# Altium footprint library 3.22-杂项.PcbLib: 985 footprints (part 41 of 64)
Each footprint in its own frame and in the unit in brackets; x right, y up, seen from the top. Pads: shape width x height; smd on the part's side, far side on the other; paste and mask are expansions set on the pad; w line width, h text height; cw(c..) or ccw(c..) is an arc to the next point about the centre after c.
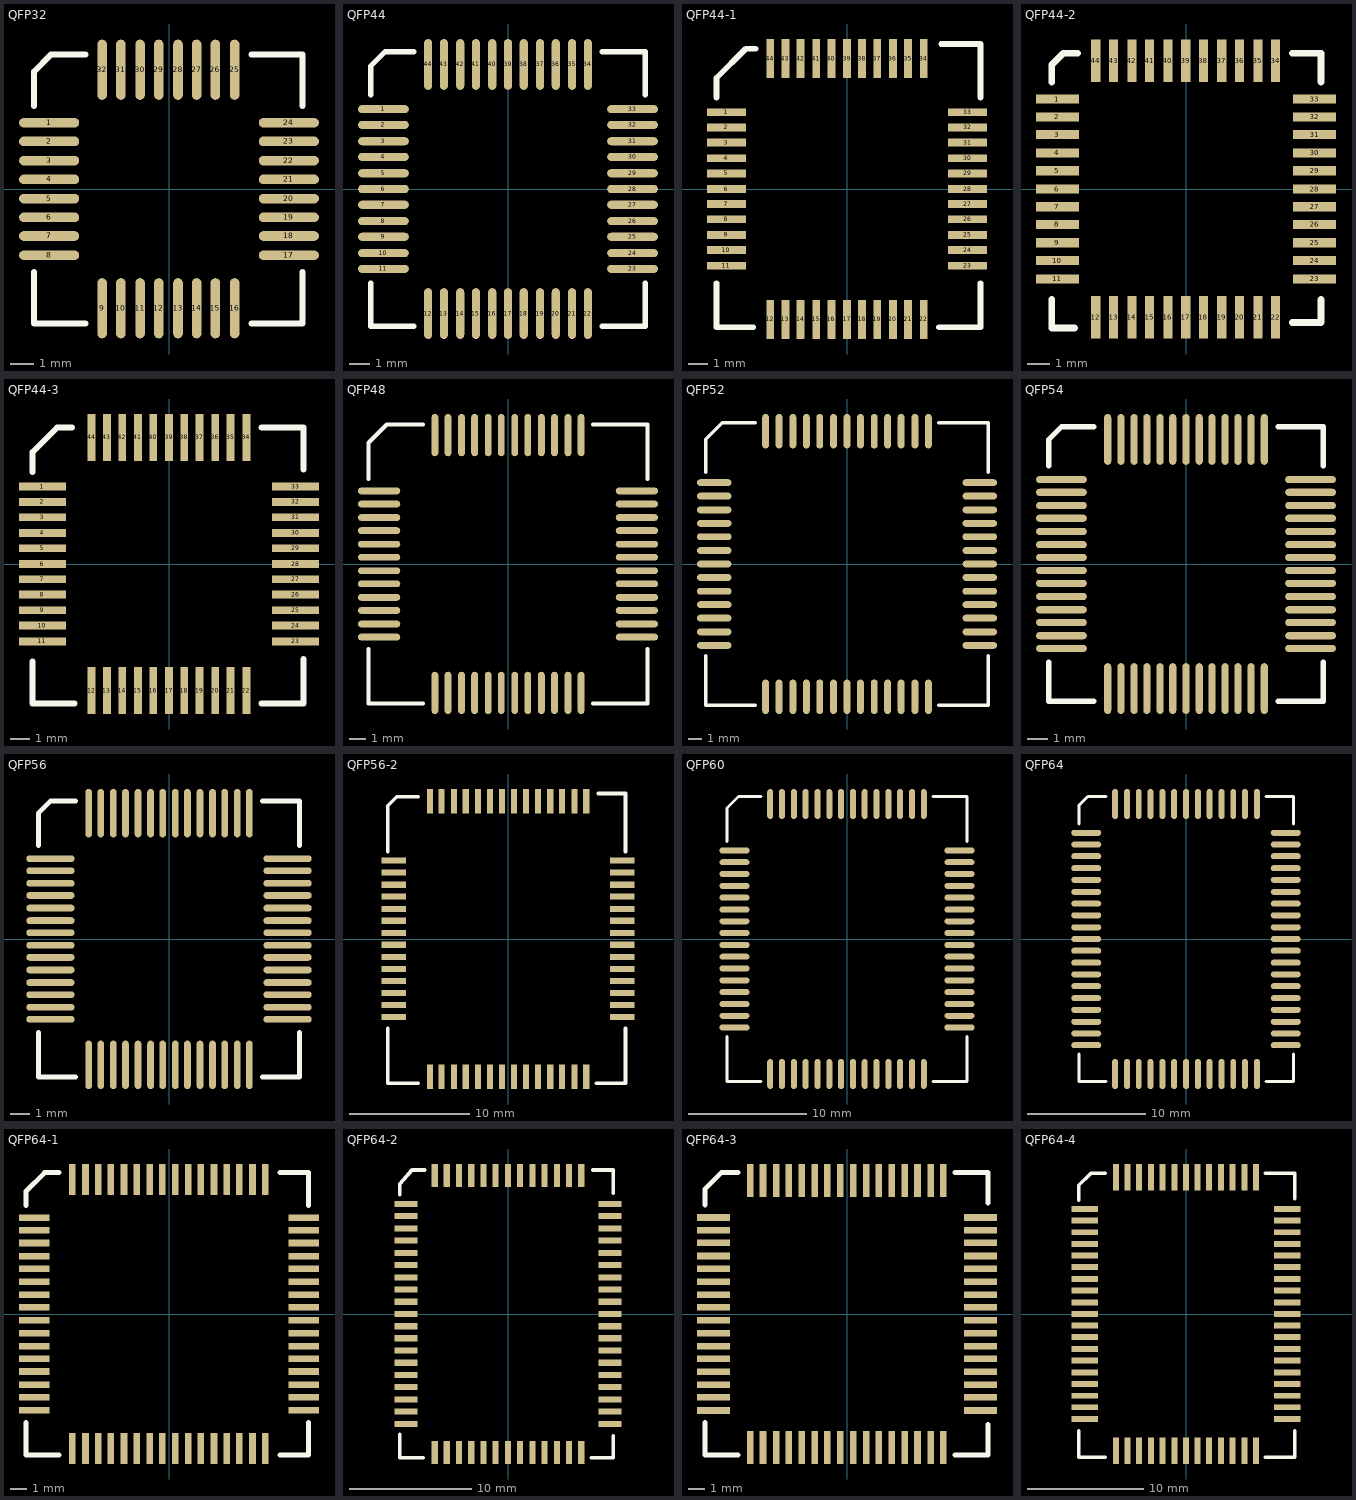
[diagram p40: the footprints below, top view; thin cyan lines are the x and y axes]

## QFP32 [mil] "ATmega16L-8AI"
pads (32):
  oval 100x16 smd: 1(-199,110) 2(-199,79) 3(-199,47) 4(-199,16) 5(-199,-16) 6(-199,-47) 7(-199,-78) 8(-199,-110) 17(199,-110) 18(199,-78) 19(199,-47) 20(199,-16) 21(199,16) 22(199,47) 23(199,79) 24(199,110)
  oval 16x100 smd: 9(-111,-198) 10(-80,-198) 11(-48,-198) 12(-17,-198) 13(15,-198) 14(46,-198) 15(77,-198) 16(109,-198) 25(109,198) 26(77,198) 27(46,198) 28(15,198) 29(-17,198) 30(-48,198) 31(-80,198) 32(-111,198)
Top Overlay:
  lines w10: -224,-138 -224,-223 -139,-223 ; -224,138 -224,195 -196,223 -139,223 ; 137,-223 222,-223 222,-138 ; 137,223 222,223 222,138

## QFP44 [mil] "ATmega16L-8AI"
pads (44):
  oval 100x16 smd: 1(-245,157) 2(-245,126) 3(-245,94) 4(-245,63) 5(-245,31) 6(-245,0) 7(-245,-31) 8(-245,-63) 9(-245,-94) 10(-245,-126) 11(-245,-157) 23(245,-157) 24(245,-126) 25(245,-94) 26(245,-63) 27(245,-31) 28(245,0) 29(245,31) 30(245,63) 31(245,94) 32(245,126) 33(245,157)
  oval 16x100 smd: 12(-157,-245) 13(-126,-245) 14(-94,-245) 15(-63,-245) 16(-31,-245) 17(0,-245) 18(31,-245) 19(63,-245) 20(94,-245) 21(126,-245) 22(157,-245) 34(157,245) 35(126,245) 36(94,245) 37(63,245) 38(31,245) 39(0,245) 40(-31,245) 41(-63,245) 42(-94,245) 43(-126,245) 44(-157,245)
Top Overlay:
  lines w10: -270,-185 -270,-270 -185,-270 ; -270,185 -270,242 -242,270 -185,270 ; 185,-270 270,-270 270,-185 ; 185,270 270,270 270,185

## QFP44-1 [mil]
pads (44):
  rect 80x16 smd: 1(-247,157) 2(-247,126) 3(-247,95) 4(-247,63) 5(-247,32) 6(-247,0) 7(-247,-31) 8(-247,-62) 9(-247,-94) 10(-247,-125) 11(-247,-157) 23(247,-157) 24(247,-125) 25(247,-94) 26(247,-62) 27(247,-31) 28(247,0) 29(247,32) 30(247,63) 31(247,95) 32(247,126) 33(247,157)
  rect 16x80 smd: 12(-157,-267) 13(-126,-267) 14(-95,-267) 15(-63,-267) 16(-32,-267) 17(0,-267) 18(31,-267) 19(62,-267) 20(94,-267) 21(125,-267) 22(157,-267) 34(157,267) 35(125,267) 36(94,267) 37(62,267) 38(31,267) 39(0,267) 40(-32,267) 41(-63,267) 42(-95,267) 43(-126,267) 44(-157,267)
Top Overlay:
  lines w12: -267,-193 -267,-283 -192,-283 ; -267,187 -267,227 -207,287 -187,287 ; 188,-283 273,-283 273,-193 ; 193,297 273,297 273,187

## QFP44-2 [mil]
pads (44):
  rect 75x16 smd: 1(-224.5,157) 2(-224.5,126) 3(-224.5,95) 4(-224.5,63) 5(-224.5,32) 6(-224.5,0) 7(-224.5,-31) 8(-224.5,-62) 9(-224.5,-94) 10(-224.5,-125) 11(-224.5,-157) 23(224.5,-157) 24(224.5,-125) 25(224.5,-94) 26(224.5,-62) 27(224.5,-31) 28(224.5,0) 29(224.5,32) 30(224.5,63) 31(224.5,95) 32(224.5,126) 33(224.5,157)
  rect 16x75 smd: 12(-157.5,-224) 13(-126.5,-224) 14(-94.5,-224) 15(-63.5,-224) 16(-31.5,-224) 17(-0.5,-224) 18(30.5,-224) 19(62.5,-224) 20(93.5,-224) 21(125.5,-224) 22(156.5,-224) 34(156.5,224) 35(125.5,224) 36(93.5,224) 37(62.5,224) 38(30.5,224) 39(-0.5,224) 40(-31.5,224) 41(-63.5,224) 42(-94.5,224) 43(-126.5,224) 44(-157.5,224)
Top Overlay:
  lines w12: -234.5,-193 -234.5,-243 -194.5,-243 ; -234.5,187 -234.5,217 -214.5,237 -189.5,237 ; 185.5,-233 235.5,-233 235.5,-193 ; 185.5,237 235.5,237 235.5,187

## QFP44-3 [mil]
pads (44):
  rect 95x16 smd: 1(-257,157) 2(-257,126) 3(-257,95) 4(-257,63) 5(-257,32) 6(-257,0) 7(-257,-31) 8(-257,-62) 9(-257,-94) 10(-257,-125) 11(-257,-157) 23(257,-157) 24(257,-125) 25(257,-94) 26(257,-62) 27(257,-31) 28(257,0) 29(257,32) 30(257,63) 31(257,95) 32(257,126) 33(257,157)
  rect 16x95 smd: 12(-157,-257) 13(-126,-257) 14(-95,-257) 15(-63,-257) 16(-32,-257) 17(0,-257) 18(31,-257) 19(62,-257) 20(94,-257) 21(125,-257) 22(157,-257) 34(157,257) 35(125,257) 36(94,257) 37(62,257) 38(31,257) 39(0,257) 40(-32,257) 41(-63,257) 42(-95,257) 43(-126,257) 44(-157,257)
Top Overlay:
  lines w12: -277,-198 -277,-283 -192,-283 ; -277,187 -277,227 -227,277 -197,277 ; 188,-283 273,-283 273,-193 ; 188,277 273,277 273,192

## QFP48 [mil]
pads (48):
  oval 100x16 smd: 1(-305,173) 2(-305,142) 3(-305,110) 4(-305,79) 5(-305,47) 6(-305,16) 7(-305,-16) 8(-305,-47) 9(-305,-79) 10(-305,-110) 11(-305,-142) 12(-305,-173) 25(305,-173) 26(305,-142) 27(305,-110) 28(305,-79) 29(305,-47) 30(305,-16) 31(305,16) 32(305,47) 33(305,79) 34(305,110) 35(305,142) 36(305,173)
  oval 16x100 smd: 13(-173,-305) 14(-142,-305) 15(-110,-305) 16(-79,-305) 17(-47,-305) 18(-16,-305) 19(16,-305) 20(47,-305) 21(79,-305) 22(110,-305) 23(142,-305) 24(173,-305) 37(173,305) 38(142,305) 39(110,305) 40(79,305) 41(47,305) 42(16,305) 43(-16,305) 44(-47,305) 45(-79,305) 46(-110,305) 47(-142,305) 48(-173,305)
Top Overlay:
  lines w10: -330,-201 -330,-330 -201,-330 ; -330,201 -330,287 -287,330 -201,330 ; 201,-330 330,-330 330,-201 ; 201,330 330,330 330,201

## QFP52 [mil]
pads (52):
  oval 100x20 smd: 1(-385,236) 2(-385,197) 3(-385,157) 4(-385,118) 5(-385,79) 6(-385,39) 7(-385,0) 8(-385,-39) 9(-385,-79) 10(-385,-118) 11(-385,-157) 12(-385,-197) 13(-385,-236) 27(385,-236) 28(385,-197) 29(385,-157) 30(385,-118) 31(385,-79) 32(385,-39) 33(385,0) 34(385,39) 35(385,79) 36(385,118) 37(385,157) 38(385,197) 39(385,236)
  oval 20x100 smd: 14(-236,-385) 15(-197,-385) 16(-157,-385) 17(-118,-385) 18(-79,-385) 19(-39,-385) 20(0,-385) 21(39,-385) 22(79,-385) 23(118,-385) 24(157,-385) 25(197,-385) 26(236,-385) 40(236,385) 41(197,385) 42(157,385) 43(118,385) 44(79,385) 45(39,385) 46(0,385) 47(-39,385) 48(-79,385) 49(-118,385) 50(-157,385) 51(-197,385) 52(-236,385)
Top Overlay:
  lines w10: -410,-266 -410,-410 -266,-410 ; -410,266 -410,362 -362,410 -266,410 ; 266,-410 410,-410 410,-266 ; 266,410 410,410 410,266

## QFP54 [mil]
pads (54):
  oval 100x14 smd: 1(-245,166) 2(-245,141) 3(-245,115) 4(-245,90) 5(-245,64) 6(-245,38) 7(-245,13) 8(-245,-13) 9(-245,-38) 10(-245,-64) 11(-245,-90) 12(-245,-115) 13(-245,-141) 14(-245,-166) 28(245,-166) 29(245,-141) 30(245,-115) 31(245,-90) 32(245,-64) 33(245,-38) 34(245,-13) 35(245,13) 36(245,38) 37(245,64) 38(245,90) 39(245,115) 40(245,141) 41(245,166)
  oval 14x100 smd: 15(-154,-245) 16(-128,-245) 17(-102,-245) 18(-77,-245) 19(-51,-245) 20(-26,-245) 21(0,-245) 22(26,-245) 23(51,-245) 24(77,-245) 25(102,-245) 26(128,-245) 27(154,-245) 42(154,245) 43(128,245) 44(102,245) 45(77,245) 46(51,245) 47(26,245) 48(0,245) 49(-26,245) 50(-51,245) 51(-77,245) 52(-102,245) 53(-128,245) 54(-154,245)
Top Overlay:
  lines w10: -270,-193 -270,-270 -181,-270 ; -270,193 -270,245 -245,270 -181,270 ; 181,-270 270,-270 270,-193 ; 181,270 270,270 270,193

## QFP56 [mil]
pads (56):
  oval 100x14 smd: 1(-245,166) 2(-245,141) 3(-245,115) 4(-245,90) 5(-245,64) 6(-245,38) 7(-245,13) 8(-245,-13) 9(-245,-38) 10(-245,-64) 11(-245,-90) 12(-245,-115) 13(-245,-141) 14(-245,-166) 29(245,-166) 30(245,-141) 31(245,-115) 32(245,-90) 33(245,-64) 34(245,-38) 35(245,-13) 36(245,13) 37(245,38) 38(245,64) 39(245,90) 40(245,115) 41(245,141) 42(245,166)
  oval 14x100 smd: 15(-166,-260) 16(-141,-260) 17(-115,-260) 18(-90,-260) 19(-64,-260) 20(-38,-260) 21(-13,-260) 22(13,-260) 23(38,-260) 24(64,-260) 25(90,-260) 26(115,-260) 27(141,-260) 28(166,-260) 43(166,260) 44(141,260) 45(115,260) 46(90,260) 47(64,260) 48(38,260) 49(13,260) 50(-13,260) 51(-38,260) 52(-64,260) 53(-90,260) 54(-115,260) 55(-141,260) 56(-166,260)
Top Overlay:
  lines w10: -270,-193 -270,-285 -193,-285 ; -270,193 -270,260 -245,285 -193,285 ; 193,-285 270,-285 270,-193 ; 193,285 270,285 270,193

## QFP56-2 [mil]
pads (56):
  rect 80x20 smd: 1(-374.5,257) 2(-374.5,218) 3(-374.5,178) 4(-374.5,139) 5(-374.5,99) 6(-374.5,60) 7(-374.5,20) 8(-374.5,-19) 9(-374.5,-59) 10(-374.5,-98) 11(-374.5,-138) 12(-374.5,-177) 13(-374.5,-217) 14(-374.5,-256) 29(374.5,-256) 30(374.5,-217) 31(374.5,-177) 32(374.5,-138) 33(374.5,-98) 34(374.5,-59) 35(374.5,-19) 36(374.5,20) 37(374.5,60) 38(374.5,99) 39(374.5,139) 40(374.5,178) 41(374.5,218) 42(374.5,257)
  rect 20x80 smd: 15(-256.5,-452) 16(-217.5,-452) 17(-177.5,-452) 18(-138.5,-452) 19(-98.5,-452) 20(-59.5,-452) 21(-19.5,-452) 22(19.5,-452) 23(59.5,-452) 24(98.5,-452) 25(138.5,-452) 26(177.5,-452) 27(217.5,-452) 28(256.5,-452) 43(256.5,452) 44(217.5,452) 45(177.5,452) 46(138.5,452) 47(98.5,452) 48(59.5,452) 49(19.5,452) 50(-19.5,452) 51(-59.5,452) 52(-98.5,452) 53(-138.5,452) 54(-177.5,452) 55(-217.5,452) 56(-256.5,452)
Top Overlay:
  lines w12: -394.5,-293 -394.5,-473 -294.5,-473 ; -394.5,287 -394.5,437 -364.5,467 -294.5,467 ; 290.5,-473 385.5,-473 385.5,-293 ; 295.5,477 385.5,477 385.5,287

## QFP60 [mil]
pads (60):
  oval 100x20 smd: 1(-375,295) 2(-375,256) 3(-375,217) 4(-375,177) 5(-375,138) 6(-375,98) 7(-375,59) 8(-375,20) 9(-375,-20) 10(-375,-59) 11(-375,-98) 12(-375,-138) 13(-375,-177) 14(-375,-217) 15(-375,-256) 16(-375,-295) 31(375,-295) 32(375,-256) 33(375,-217) 34(375,-177) 35(375,-138) 36(375,-98) 37(375,-59) 38(375,-20) 39(375,20) 40(375,59) 41(375,98) 42(375,138) 43(375,177) 44(375,217) 45(375,256) 46(375,295)
  oval 20x100 smd: 17(-256,-450) 18(-217,-450) 19(-177,-450) 20(-138,-450) 21(-98,-450) 22(-59,-450) 23(-20,-450) 24(20,-450) 25(59,-450) 26(98,-450) 27(138,-450) 28(177,-450) 29(217,-450) 30(256,-450) 47(256,450) 48(217,450) 49(177,450) 50(138,450) 51(98,450) 52(59,450) 53(20,450) 54(-20,450) 55(-59,450) 56(-98,450) 57(-138,450) 58(-177,450) 59(-217,450) 60(-256,450)
Top Overlay:
  lines w10: -400,-325 -400,-475 -286,-475 ; -400,325 -400,437 -362,475 -286,475 ; 286,-475 400,-475 400,-325 ; 286,475 400,475 400,325

## QFP64 [mil]
pads (64):
  oval 100x20 smd: 1(-332.5,354) 2(-332.5,315) 3(-332.5,276) 4(-332.5,236) 5(-332.5,197) 6(-332.5,157) 7(-332.5,118) 8(-332.5,79) 9(-332.5,39) 10(-332.5,0) 11(-332.5,-39) 12(-332.5,-79) 13(-332.5,-118) 14(-332.5,-157) 15(-332.5,-197) 16(-332.5,-236) 17(-332.5,-276) 18(-332.5,-315) 19(-332.5,-354) 33(332.5,-354) 34(332.5,-315) 35(332.5,-276) 36(332.5,-236) 37(332.5,-197) 38(332.5,-157) 39(332.5,-118) 40(332.5,-79) 41(332.5,-39) 42(332.5,0) 43(332.5,39) 44(332.5,79) 45(332.5,118) 46(332.5,157) 47(332.5,197) 48(332.5,236) 49(332.5,276) 50(332.5,315) 51(332.5,354)
  oval 20x100 smd: 20(-236.5,-450) 21(-196.5,-450) 22(-157.5,-450) 23(-118.5,-450) 24(-78.5,-450) 25(-39.5,-450) 26(0.5,-450) 27(39.5,-450) 28(78.5,-450) 29(118.5,-450) 30(157.5,-450) 31(196.5,-450) 32(236.5,-450) 52(236.5,450) 53(196.5,450) 54(157.5,450) 55(118.5,450) 56(78.5,450) 57(39.5,450) 58(0.5,450) 59(-39.5,450) 60(-78.5,450) 61(-118.5,450) 62(-157.5,450) 63(-196.5,450) 64(-236.5,450)
Top Overlay:
  lines w10: -357.5,-384 -357.5,-475 -266.5,-475 ; -357.5,384 -357.5,445 -327.5,475 -266.5,475 ; 266.5,-475 357.5,-475 357.5,-384 ; 266.5,475 357.5,475 357.5,384

## QFP64-1 [mil]
pads (64):
  rect 75x16 smd: 1(-329,235.5) 2(-329,204.5) 3(-329,173.5) 4(-329,141.5) 5(-329,110.5) 6(-329,78.5) 7(-329,47.5) 8(-329,16.5) 9(-329,-15.5) 10(-329,-46.5) 11(-329,-78.5) 12(-329,-109.5) 13(-329,-140.5) 14(-329,-172.5) 15(-329,-203.5) 16(-329,-235.5) 33(329,-235.5) 34(329,-203.5) 35(329,-172.5) 36(329,-140.5) 37(329,-109.5) 38(329,-78.5) 39(329,-46.5) 40(329,-15.5) 41(329,16.5) 42(329,47.5) 43(329,78.5) 44(329,110.5) 45(329,141.5) 46(329,173.5) 47(329,204.5) 48(329,235.5)
  rect 16x75 smd: 17(-236,-328.5) 18(-204,-328.5) 19(-173,-328.5) 20(-142,-328.5) 21(-110,-328.5) 22(-79,-328.5) 23(-47,-328.5) 24(-16,-328.5) 25(15,-328.5) 26(47,-328.5) 27(78,-328.5) 28(110,-328.5) 29(141,-328.5) 30(172,-328.5) 31(204,-328.5) 32(235,-328.5) 49(235,328.5) 50(204,328.5) 51(172,328.5) 52(141,328.5) 53(110,328.5) 54(78,328.5) 55(47,328.5) 56(15,328.5) 57(-16,328.5) 58(-47,328.5) 59(-79,328.5) 60(-110,328.5) 61(-142,328.5) 62(-173,328.5) 63(-204,328.5) 64(-236,328.5)
Top Overlay:
  lines w12: -349,-264.5 -349,-344.5 -269,-344.5 ; -349,265.5 -349,300.5 -304,345.5 -269,345.5 ; 271,-344.5 341,-344.5 341,-264.5 ; 271,345.5 341,345.5 341,265.5

## QFP64-2 [mil]
pads (64):
  rect 75x20 smd: 1(-330,355.5) 2(-330,316.5) 3(-330,276.5) 4(-330,237.5) 5(-330,197.5) 6(-330,158.5) 7(-330,118.5) 8(-330,79.5) 9(-330,39.5) 10(-330,0.5) 11(-330,-39.5) 12(-330,-78.5) 13(-330,-118.5) 14(-330,-157.5) 15(-330,-197.5) 16(-330,-236.5) 17(-330,-276.5) 18(-330,-315.5) 19(-330,-355.5) 33(330,-355.5) 34(330,-315.5) 35(330,-276.5) 36(330,-236.5) 37(330,-197.5) 38(330,-157.5) 39(330,-118.5) 40(330,-78.5) 41(330,-39.5) 42(330,0.5) 43(330,39.5) 44(330,79.5) 45(330,118.5) 46(330,158.5) 47(330,197.5) 48(330,237.5) 49(330,276.5) 50(330,316.5) 51(330,355.5)
  rect 20x75 smd: 20(-237,-447.5) 21(-198,-447.5) 22(-158,-447.5) 23(-119,-447.5) 24(-79,-447.5) 25(-40,-447.5) 26(0,-447.5) 27(39,-447.5) 28(79,-447.5) 29(118,-447.5) 30(158,-447.5) 31(197,-447.5) 32(237,-447.5) 52(237,447.5) 53(197,447.5) 54(158,447.5) 55(118,447.5) 56(79,447.5) 57(39,447.5) 58(0,447.5) 59(-40,447.5) 60(-79,447.5) 61(-119,447.5) 62(-158,447.5) 63(-198,447.5) 64(-237,447.5)
Top Overlay:
  lines w12: -350,-389.5 -350,-464.5 -275,-464.5 ; -350,385.5 -350,420.5 -310,465.5 -270,465.5 ; 270,-464.5 340,-464.5 340,-394.5 ; 275,465.5 340,465.5 340,390.5

## QFP64-3 [mil]
pads (64):
  rect 80x16 smd: 1(-326,235.5) 2(-326,204.5) 3(-326,173.5) 4(-326,141.5) 5(-326,110.5) 6(-326,78.5) 7(-326,47.5) 8(-326,16.5) 9(-326,-15.5) 10(-326,-46.5) 11(-326,-78.5) 12(-326,-109.5) 13(-326,-140.5) 14(-326,-172.5) 15(-326,-203.5) 16(-326,-235.5) 33(326,-235.5) 34(326,-203.5) 35(326,-172.5) 36(326,-140.5) 37(326,-109.5) 38(326,-78.5) 39(326,-46.5) 40(326,-15.5) 41(326,16.5) 42(326,47.5) 43(326,78.5) 44(326,110.5) 45(326,141.5) 46(326,173.5) 47(326,204.5) 48(326,235.5)
  rect 16x80 smd: 17(-236,-325.5) 18(-205,-325.5) 19(-173,-325.5) 20(-142,-325.5) 21(-110,-325.5) 22(-79,-325.5) 23(-48,-325.5) 24(-16,-325.5) 25(15,-325.5) 26(47,-325.5) 27(78,-325.5) 28(109,-325.5) 29(141,-325.5) 30(172,-325.5) 31(204,-325.5) 32(235,-325.5) 49(235,325.5) 50(204,325.5) 51(172,325.5) 52(141,325.5) 53(109,325.5) 54(78,325.5) 55(47,325.5) 56(15,325.5) 57(-16,325.5) 58(-48,325.5) 59(-79,325.5) 60(-110,325.5) 61(-142,325.5) 62(-173,325.5) 63(-205,325.5) 64(-236,325.5)
Top Overlay:
  lines w12: -346,-264.5 -346,-344.5 -266,-344.5 ; -346,265.5 -346,305.5 -306,345.5 -266,345.5 ; 264,-344.5 344,-344.5 344,-269.5 ; 264,345.5 344,345.5 344,270.5

## QFP64-4 [mil]
pads (64):
  rect 90x20 smd: 1(-342.5,355.5) 2(-342.5,316.5) 3(-342.5,276.5) 4(-342.5,237.5) 5(-342.5,197.5) 6(-342.5,158.5) 7(-342.5,118.5) 8(-342.5,79.5) 9(-342.5,39.5) 10(-342.5,0.5) 11(-342.5,-39.5) 12(-342.5,-78.5) 13(-342.5,-118.5) 14(-342.5,-157.5) 15(-342.5,-197.5) 16(-342.5,-236.5) 17(-342.5,-276.5) 18(-342.5,-315.5) 19(-342.5,-355.5) 33(342.5,-355.5) 34(342.5,-315.5) 35(342.5,-276.5) 36(342.5,-236.5) 37(342.5,-197.5) 38(342.5,-157.5) 39(342.5,-118.5) 40(342.5,-78.5) 41(342.5,-39.5) 42(342.5,0.5) 43(342.5,39.5) 44(342.5,79.5) 45(342.5,118.5) 46(342.5,158.5) 47(342.5,197.5) 48(342.5,237.5) 49(342.5,276.5) 50(342.5,316.5) 51(342.5,355.5)
  rect 20x90 smd: 20(-237.5,-462.5) 21(-197.5,-462.5) 22(-158.5,-462.5) 23(-118.5,-462.5) 24(-79.5,-462.5) 25(-39.5,-462.5) 26(-0.5,-462.5) 27(39.5,-462.5) 28(78.5,-462.5) 29(118.5,-462.5) 30(157.5,-462.5) 31(197.5,-462.5) 32(236.5,-462.5) 52(236.5,462.5) 53(197.5,462.5) 54(157.5,462.5) 55(118.5,462.5) 56(78.5,462.5) 57(39.5,462.5) 58(-0.5,462.5) 59(-39.5,462.5) 60(-79.5,462.5) 61(-118.5,462.5) 62(-158.5,462.5) 63(-197.5,462.5) 64(-237.5,462.5)
Top Overlay:
  lines w12: -362.5,-394.5 -362.5,-484.5 -272.5,-484.5 ; -362.5,385.5 -362.5,435.5 -322.5,475.5 -272.5,475.5 ; 267.5,-484.5 367.5,-484.5 367.5,-394.5 ; 267.5,475.5 367.5,475.5 367.5,390.5